# Altium footprint library 3D_MIG_Controller.PCBLIB: 560 footprints (part 4 of 35)
Each footprint in its own frame and in the unit in brackets; x right, y up, seen from the top. Pads: shape width x height; smd on the part's side, far side on the other; paste and mask are expansions set on the pad; w line width, h text height; cw(c..) or ccw(c..) is an arc to the next point about the centre after c.
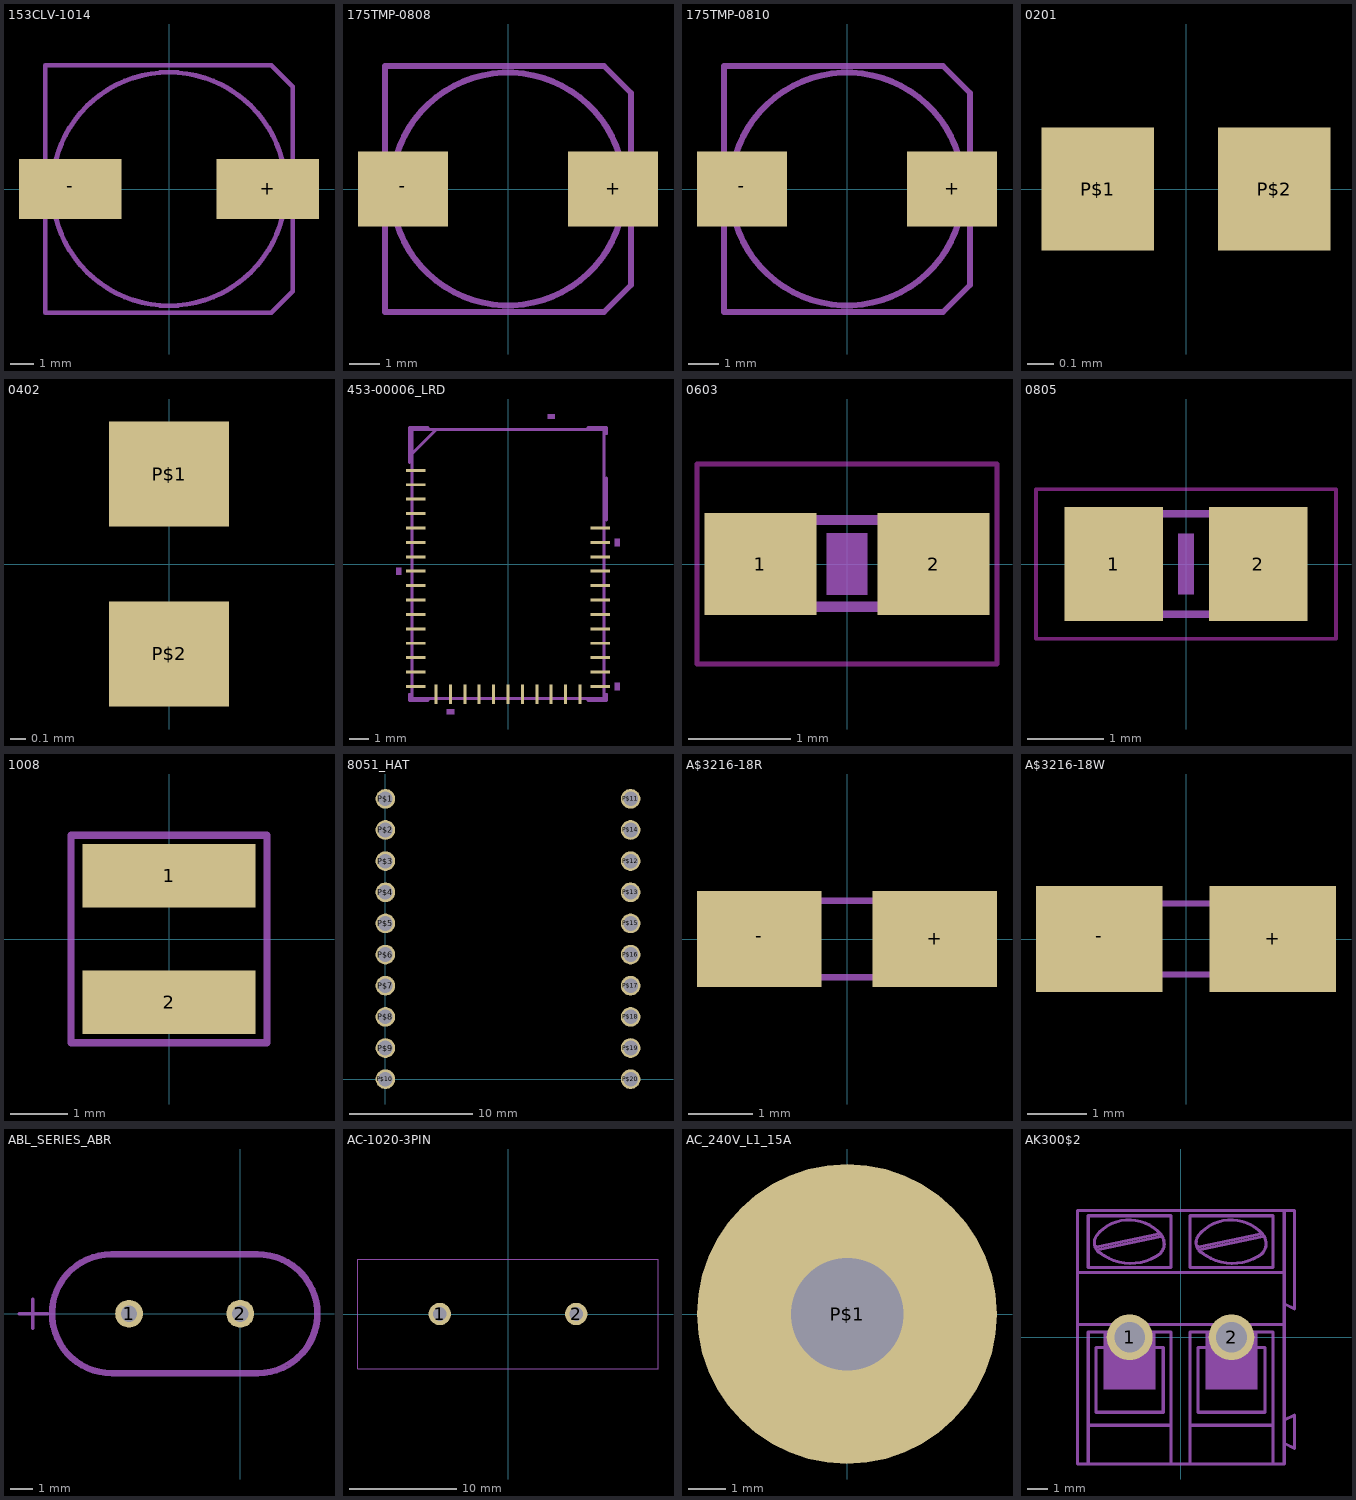
[diagram p3: the footprints below, top view; thin cyan lines are the x and y axes]

## 153CLV-1014 [mil]
pads (2):
  rect 169.29x98.43 smd: +(163.39,0) -(-163.39,0)
tDocu:
  lines w8: -204.72,-59.06 -204.72,59.06 ; -183.07,-61.02 cw(c-0.01,0) -183.07,61.02 ; 183.07,-61.02 ccw(c0.01,0) 183.07,61.02 ; 204.72,-59.06 204.72,59.06
tPlace:
  lines w8: -204.72,-59.06 -204.72,-204.72 169.29,-204.72 204.72,-169.29 204.72,-59.06 ; -204.72,59.06 -204.72,204.72 169.29,204.72 204.72,169.29 204.72,59.06 ; -183.07,-61.02 ccw(c0,0) 183.07,-61.02 ; -183.07,61.02 cw(c0,0) 183.07,61.02

## 175TMP-0808 [mm]
pads (2):
  rect 3x2.5 smd: +(3.5,0) -(-3.5,0)
tDocu:
  lines w0.203: -4.1,-1.55 -4.1,1.55 ; -3.6,-1.45 cw(c0,0) -3.6,1.45 ; 3.6,-1.45 ccw(c0,0) 3.6,1.45 ; 4.1,-1.55 4.1,1.5
tPlace:
  lines w0.203: -4.1,-1.55 -4.1,-4.1 3.2,-4.1 4.1,-3.2 4.1,-1.55 ; -4.1,1.55 -4.1,4.1 3.2,4.1 4.1,3.2 4.1,1.5 ; -3.6,-1.45 ccw(c0,0) 3.6,-1.45 ; -3.6,1.45 cw(c0,0) 3.6,1.45

## 175TMP-0810 [mm]
pads (2):
  rect 3x2.5 smd: +(3.5,0) -(-3.5,0)
tDocu:
  lines w0.203: -4.1,-1.55 -4.1,1.55 ; -3.6,-1.45 cw(c0,0) -3.6,1.45 ; 3.6,-1.45 ccw(c0,0) 3.6,1.45 ; 4.1,-1.55 4.1,1.5
tPlace:
  lines w0.203: -4.1,-1.55 -4.1,-4.1 3.2,-4.1 4.1,-3.2 4.1,-1.55 ; -4.1,1.55 -4.1,4.1 3.2,4.1 4.1,3.2 4.1,1.5 ; -3.6,-1.45 ccw(c0,0) 3.6,-1.45 ; -3.6,1.45 cw(c0,0) 3.6,1.45

## 0201 [mm]
pads (2):
  rect 0.42x0.46 smd: P$1(-0.33,0) P$2(0.33,0)

## 0402 [mil]
pads (2):
  rect 31.5x27.56 smd: P$1(0,23.62) P$2(0,-23.62)

## 453-00006_LRD [mil]
pads (39):
  rect 40x6 smd: 1(-189,191.93) 2(-189,162.4) 3(-189,132.87) 4(-189,103.35) 5(-189,73.82) 6(-189,44.29) 7(-189,14.76) 8(-189,-14.76) 9(-189,-44.29) 10(-189,-73.82) 11(-189,-103.35) 12(-189,-132.87) 13(-189,-162.4) 14(-189,-191.93) 15(-189,-221.46) 16(-189,-250.98) 28(189,-250.98) 29(189,-221.46) 30(189,-191.93) 31(189,-162.4) 32(189,-132.87) 33(189,-103.35) 34(189,-73.82) 35(189,-44.29) 36(189,-14.76) 37(189,14.76) 38(189,44.29) 39(189,73.82)
  rect 6x40 smd: 17(-147.64,-267.5) 18(-118.11,-267.5) 19(-88.58,-267.5) 20(-59.06,-267.5) 21(-29.53,-267.5) 22(0,-267.5) 23(29.53,-267.5) 24(59.06,-267.5) 25(88.58,-267.5) 26(118.11,-267.5) 27(147.64,-267.5)
tDocu:
  lines w6: -197,-256 -197,-246 ; -197,-226 -197,-216 ; -197,-197 -197,-187 ; -197,-167 -197,-157 ; -197,-138 -197,-128 ; -197,-108 -197,-98 ; -197,-79 -197,-69 ; -197,-49 -197,-39 ; -197,-20 -197,-10 ; -197,10 -197,20 ; -197,39 -197,49 ; -197,69 -197,79 ; -197,98 -197,108 ; -197,128 -197,138 ; -197,157 -197,167 ; -197,187 -197,197 ; -197,216 -197,226 -147,276 ; -197,246 -197,256 ; -153,-276 -143,-276 ; -153,276 -143,276 ; -123,-276 -113,-276 ; -123,276 -113,276 ; -94,-276 -84,-276 ; -94,276 -84,276 ; -64,-276 -54,-276 ; -64,276 -54,276 ; -35,-276 -25,-276 ; -35,276 -25,276 ; -5,-276 5,-276 ; -5,276 5,276 ; 25,-276 35,-276 ; 25,276 35,276 ; 54,-276 64,-276 ; 54,276 64,276 ; 84,-276 94,-276 ; 84,276 94,276 ; 113,-276 123,-276 ; 113,276 123,276 ; 143,-276 153,-276 ; 143,276 153,276 ; 197,-256 197,-246 ; 197,-226 197,-216 ; 197,-197 197,-187 ; 197,-167 197,-157 ; 197,-138 197,-128 ; 197,-108 197,-98 ; 197,-79 197,-69 ; 197,-49 197,-39 ; 197,-20 197,-10 ; 197,10 197,20 ; 197,39 197,49 ; 197,69 197,79 ; 197,98 197,108 ; 197,128 197,138 ; 197,157 197,167 ; 197,187 197,197 ; 197,216 197,226 ; 197,246 197,256 ; -197,-276 197,-276 197,276 -197,276 -197,-276
  text "*" at -192,241 h77.5
tPlace:
  region: -229,-7.26 -229,-22.26 -219,-22.26 -219,-7.26
  region: -125.61,-297.5 -125.61,-307.5 -110.61,-307.5 -110.61,-297.5
  region: 229,-243.48 229,-258.48 219,-258.48 219,-243.48
  region: 229,51.79 229,36.79 219,36.79 219,51.79
  region: 81.08,297.5 81.08,307.5 96.08,307.5 96.08,297.5
  lines w6: -202,-267 -202,-280 -164,-280 ; -202,208 -202,280 -164,280 ; 164,-280 202,-280 202,-267 ; 164,280 202,280 202,267 ; 202,90 202,176
  text "*" at -257,241 h77.5

## 0603 [mm]
pads (2):
  rect 1.1x1 smd: 1(-0.85,0) 2(0.85,0)
Top keep-out:
  lines w0.051: -1.473,-0.983 1.473,-0.983 1.473,0.983 -1.473,0.983 -1.473,-0.983
tDocu:
  region: -0.838,-0.47 -0.838,0.48 -0.338,0.48 -0.338,-0.47
  region: 0.33,-0.47 0.33,0.48 0.83,0.48 0.83,-0.47
  lines w0.102: -0.356,-0.419 0.356,-0.419 ; -0.356,0.432 0.356,0.432
tGlue:
  region: -0.2,-0.3 -0.2,0.3 0.2,0.3 0.2,-0.3

## 0805 [mil]
pads (2):
  rect 51.18x59.06 smd: 1(-37.4,0) 2(37.4,0)
Top keep-out:
  lines w2: -77.68,-38.7 77.68,-38.7 77.68,38.7 -77.68,38.7 -77.68,-38.7
tDocu:
  region: -43,-28.5 -43,28.59 -13.47,28.59 -13.47,-28.5
  region: 14,-28.5 14,28.59 43.53,28.59 43.53,-28.5
  lines w4: -15,25.98 15,25.98 ; -14.02,-25.98 15,-25.98
tGlue:
  region: -3.94,-15.75 -3.94,15.75 3.94,15.75 3.94,-15.75

## 1008 [mm]
pads (2):
  rect 3x1.1 smd: 1(0,1.1) 2(0,-1.1)
tPlace:
  lines w0.127: -1.7,-1.8 1.7,-1.8 1.7,1.8 -1.7,1.8 -1.7,-1.8

## 8051_HAT [mil]
pads (20):
  round 62.99 hole 47.24: P$1(0,900) P$2(0,800) P$3(0,700) P$4(0,600) P$5(0,500) P$6(0,400) P$7(0,300) P$8(0,200) P$9(0,100) P$10(0,0) P$11(787.4,900) P$12(787.4,700) P$13(787.4,600) P$14(787.4,800) P$15(787.4,500) P$16(787.4,400) P$17(787.4,300) P$18(787.4,200) P$19(787.4,100) P$20(787.4,0)

## A$3216-18R [mil]
pads (2):
  rect 76.77x59.06 smd: +(54.13,0) -(-54.13,0)
tDocu:
  region: -62.99,-23.62 -62.99,23.62 -58.07,23.62 -58.07,-23.62
  region: 58.07,-23.62 58.07,23.62 62.99,23.62 62.99,-23.62
  region: 31.5,-24.61 31.5,24.61 43.31,24.61 43.31,-24.61
  lines w4: -57.09,-23.62 57.09,-23.62 57.09,23.62 -57.09,23.62 -57.09,-23.62

## A$3216-18W [mil]
pads (2):
  rect 84.65x70.87 smd: +(58.07,0) -(-58.07,0)
tDocu:
  region: -62.99,-23.62 -62.99,23.62 -58.07,23.62 -58.07,-23.62
  region: 58.07,-23.62 58.07,23.62 62.99,23.62 62.99,-23.62
  region: 31.5,-24.61 31.5,24.61 43.31,24.61 43.31,-24.61
  lines w4: -57.09,-23.62 57.09,-23.62 57.09,23.62 -57.09,23.62 -57.09,-23.62

## ABL_SERIES_ABR [mil]
pads (2):
  round 48 hole 28: 1(-192,0) 2(0,0)
tDocu:
  lines w6: -382,0 -332,0 ; -358,-25 -358,25 ; -222,100 30,100 ; 30,-100 -222,-100 ; -222,-100 cw(c-222.5,0) -223,100 ccw(c-222.5,0) -222,-100 ; 30,100 cw(c30.5,0) 31,-100 ccw(c30.5,0) 30,100
tPlace:
  lines w6: -382,0 -332,0 ; -358,-25 -358,25 ; -222,105 30,105 ; 30,-105 -222,-105 ; -222,-105 cw(c-222.5,0) -223,105 ccw(c-222.5,0) -222,-105 ; 30,105 cw(c30.5,-0.5) 136,0 ; 30,105 cw(c30.5,-0.5) 136,0 ; 136,0 cw(c31,0) 31,-105 ccw(c31,0) 136,0

## AC-1020-3PIN [mil]
pads (2):
  round 82 hole 50: 1(-250,0) 2(250,0)
tPlace:
  lines w3.94: -550,-200 -550,200 550,200 550,-200 -550,-200

## AC_240V_L1_15A [mm]
pads (1):
  round 8 hole 3: P$1(0,0)

## AK300$2 [mil]
pads (2):
  round 88.59 hole 59.06: 1(-99,0) 2(98,0)
tDocu:
  region: -149,-100 -149,10 -49,10 -49,-100
  region: 48,-100 48,10 148,10 148,-100
  lines w6: -164,-20 -149,-20 ; -164,10 -34,10 ; -164,25 -34,25 ; -49,-20 -34,-20 ; 33,-20 48,-20 ; 33,10 163,10 ; 33,25 163,25 ; 148,-20 163,-20
tPlace:
  lines w6: -164,-20 -164,-145 -34,-145 -34,-20 ; -164,10 -179,10 -179,-170 ; -164,25 -200,25 ; -163,175 -43,200 ; -163,197 cw(c-99.99,146) -38.81,199.17 ; -161,199 ccw(c-144,183) -155.34,162.59 ; -158,170 -38,195 ; -157,164 ccw(c-97,239) -39.37,162.16 ; -41.2,160.82 ccw(c-59,181) -39,199 ; -34,10 -19,10 -19,-170 ; -34,25 33,25 ; 33,-20 33,-145 163,-145 163,-20 ; 33,10 18,10 18,-170 ; 34,175 154,200 ; 34,197 cw(c97,146) 158.18,199.16 ; 36,199 ccw(c53,183) 41.66,162.59 ; 39,170 159,195 ; 40,164 ccw(c100,239) 157.63,162.16 ; 155.8,160.82 ccw(c138,181) 158,199 ; 163,10 178,10 178,-170 ; 163,25 200,25 ; -200,25 -200,-245 -179,-245 ; -200,25 -200,125 ; -200,125 200,125 ; -200,125 -200,245 200,245 ; -179,-245 -19,-245 ; -179,-245 -179,-170 ; -179,-170 -19,-170 ; -19,-245 -19,-170 ; -19,-245 18,-245 ; 18,-245 18,-170 ; 18,-245 178,-245 ; 18,-170 178,-170 ; 178,-245 200,-245 200,-205 ; 178,-245 178,-170 ; 200,-205 220,-215 220,-150 200,-160 ; 200,-205 200,-160 ; 200,-160 200,25 ; 200,25 200,65 ; 200,65 220,55 220,245 200,245 ; 200,65 200,125 ; 200,125 200,245 ; -179,135 -19,135 -19,235 -179,235 -179,135 ; 18,135 18,235 178,235 178,135 18,135
  text "1" at -177,50 h62
  text "2" at 23,50 h62